# Altium footprint library LDCN Components.PcbLib: 426 footprints (part 4 of 27)
Each footprint in its own frame and in the unit in brackets; x right, y up, seen from the top. Pads: shape width x height; smd on the part's side, far side on the other; paste and mask are expansions set on the pad; w line width, h text height; cw(c..) or ccw(c..) is an arc to the next point about the centre after c.
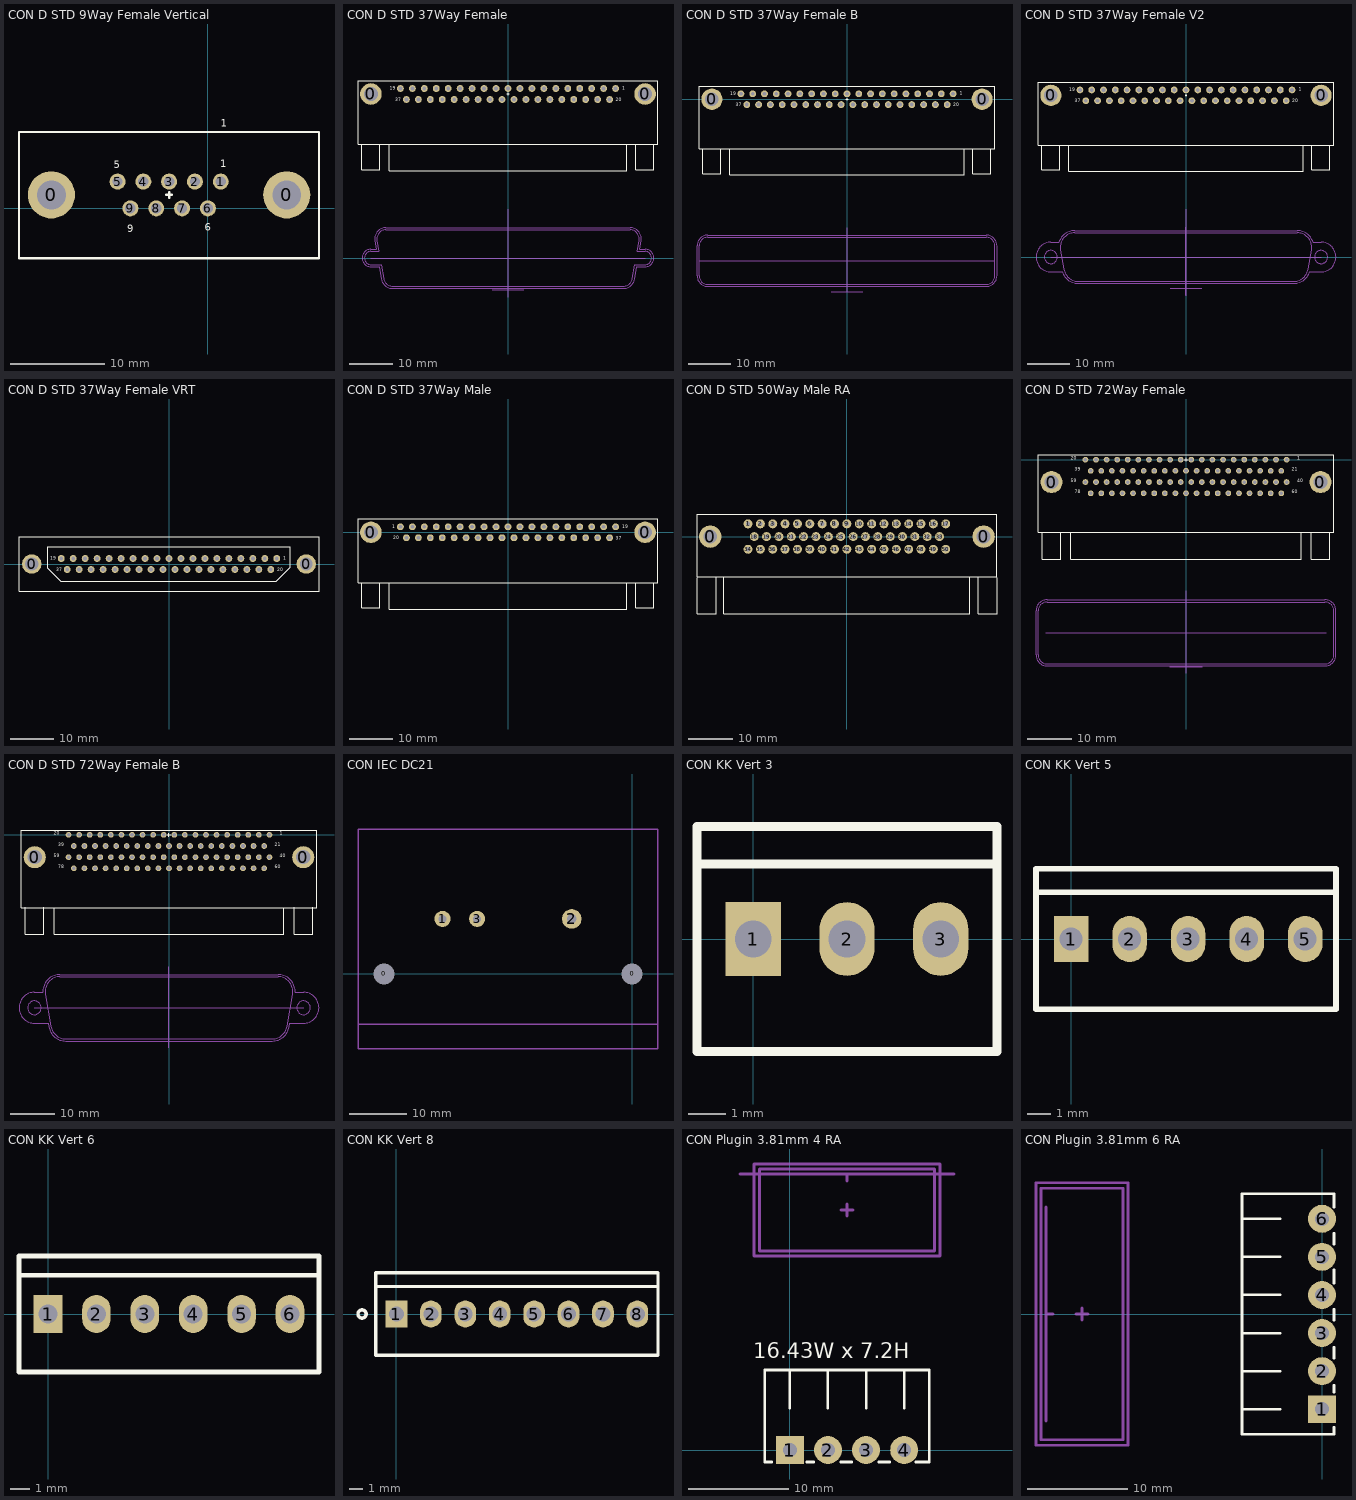
[diagram p3: the footprints below, top view; thin cyan lines are the x and y axes]

## CON D STD 9Way Female Vertical [mm] "CONN D-SUB RCPT 9POS VERT SLDR"
height 12.17
pads (11):
  round 5 hole 3.05: 0(-16.61,1.42) 0(8.38,1.42)
  round 1.7 hole 1.1: 1(1.37,2.84) 2(-1.37,2.84) 3(-4.11,2.84) 4(-6.85,2.84) 5(-9.59,2.84) 6(0,0) 7(-2.74,0) 8(-5.48,0) 9(-8.22,0)
Top Overlay:
  lines w0.254: -4.415,1.42 -3.815,1.42 ; -4.115,1.12 -4.115,1.72 ; -20.05,-5.3 11.8,-5.3 11.8,8.1 -20.05,8.1 -20.05,-5.3
  text "1" at 1.375,8.64 h0.76
  text "6" at -0.325,-2.36 h0.76
  text "9" at -8.575,-2.56 h0.76
  text "5" at -9.975,4.24 h0.76
  text "1" at 1.325,4.34 h0.76
3D body "c-3-338313-2-e-3d.stp": height 12.16, standoff -3.23, extent -19.57,-4.86 11.42,7.79

## CON D STD 37Way Female [mm] "37 Way Male D Sub RA PCB"
pads (39):
  round 5 hole 3.2: 0(-31.75,38) 0(31.75,38)
  round 1.6 hole 0.9: 1(24.93,39.27) 2(22.16,39.27) 3(19.39,39.27) 4(16.62,39.27) 5(13.85,39.27) 6(11.08,39.27) 7(8.31,39.27) 8(5.54,39.27) 9(2.77,39.27) 10(0,39.27) 11(-2.77,39.27) 12(-5.54,39.27) 13(-8.31,39.27) 14(-11.08,39.27) 15(-13.85,39.27) 16(-16.62,39.27) 17(-19.39,39.27) 18(-22.16,39.27) 19(-24.93,39.27) 20(23.545,36.73) 21(20.775,36.73) 22(18.005,36.73) 23(15.235,36.73) 24(12.465,36.73) 25(9.695,36.73) 26(6.925,36.73) 27(4.155,36.73) 28(1.385,36.73) 29(-1.385,36.73) 30(-4.155,36.73) 31(-6.925,36.73) 32(-9.695,36.73) 33(-12.465,36.73) 34(-15.235,36.73) 35(-18.005,36.73) 36(-20.775,36.73) 37(-23.545,36.73)
Top Overlay:
  lines w0.254: -33.9,26.3 -33.9,20.5 -29.7,20.5 -29.7,26.3 ; -27.5,26.3 -27.5,20.2 27.5,20.2 27.5,26.3 ; -19.05,20.2 19.05,20.2 ; -0.3,38 0.3,38 ; 0,37.7 0,38.3 ; 29.6,26.3 29.6,20.5 33.8,20.5 33.8,26.3 ; -34.75,26.3 -34.75,41.1 34.75,41.1 34.75,26.3 -34.75,26.3
  text "1" at 26.485,39.03 h0.76
  text "19" at -27.415,38.93 h0.76
  text "20" at 24.985,36.33 h0.76
  text "37" at -26.115,36.33 h0.76
Mechanical 21:
  lines w0.254: -28.796,-4.785 ccw(c-26.718,-4.419) -26.718,-6.529 ; -28.795,-4.785 -29.37,-1.523 -31.75,-1.524 cw(c-31.75,0) -31.75,1.524 -29.908,1.524 -30.353,4.049 cw(c-28.275,4.415) -28.275,6.525 ; -28.275,6.53 0,6.53 28.275,6.53 ; -26.718,-6.53 0,-6.53 26.718,-6.53 ; 26.718,-6.529 ccw(c26.718,-4.419) 28.796,-4.785 ; 28.275,6.525 cw(c28.275,4.415) 30.353,4.049 29.908,1.524 31.75,1.524 cw(c31.75,0) 31.75,-1.524 29.37,-1.523 28.795,-4.785
Mechanical 22:
  lines w0.254: -31.75,0 31.75,0 ; -3.65,-7.3 3.65,-7.3 ; 0,-9.125 0,11.25 ; 0,-7.3 0,0
Mechanical 25:
  lines w0.254: -30.851,3.968 -30.508,2.024 -31.75,2.024 ccw(c-31.75,0) -31.75,-2.024 -29.87,-2.023 -29.367,-4.875 ccw(c-26.797,-4.422) -26.797,-7.032 0,-7.032 26.797,-7.032 ccw(c26.797,-4.422) 29.367,-4.875 29.87,-2.023 31.75,-2.024 ccw(c31.75,0) 31.75,2.024 30.508,2.024 30.851,3.968 ; -30.849,3.968 cw(c-28.279,4.421) -28.279,7.031 -0.1,7.031 ; 0.1,7.031 28.279,7.031 cw(c28.279,4.421) 30.849,3.968

## CON D STD 37Way Female B [mm] "37 Way Male D Sub RA PCB"
pads (39):
  round 5 hole 3.2: 0(-31.75,0) 0(31.75,0)
  round 1.6 hole 0.9: 1(24.93,1.27) 2(22.16,1.27) 3(19.39,1.27) 4(16.62,1.27) 5(13.85,1.27) 6(11.08,1.27) 7(8.31,1.27) 8(5.54,1.27) 9(2.77,1.27) 10(0,1.27) 11(-2.77,1.27) 12(-5.54,1.27) 13(-8.31,1.27) 14(-11.08,1.27) 15(-13.85,1.27) 16(-16.62,1.27) 17(-19.39,1.27) 18(-22.16,1.27) 19(-24.93,1.27) 20(23.545,-1.27) 21(20.775,-1.27) 22(18.005,-1.27) 23(15.235,-1.27) 24(12.465,-1.27) 25(9.695,-1.27) 26(6.925,-1.27) 27(4.155,-1.27) 28(1.385,-1.27) 29(-1.385,-1.27) 30(-4.155,-1.27) 31(-6.925,-1.27) 32(-9.695,-1.27) 33(-12.465,-1.27) 34(-15.235,-1.27) 35(-18.005,-1.27) 36(-20.775,-1.27) 37(-23.545,-1.27)
Top Overlay:
  lines w0.254: -33.9,-11.7 -33.9,-17.5 -29.7,-17.5 -29.7,-11.7 ; -27.5,-11.7 -27.5,-17.8 27.5,-17.8 27.5,-11.7 ; -19.05,-17.8 19.05,-17.8 ; -0.25,0 0.25,0 ; 0,-0.25 0,0.25 ; 29.6,-11.7 29.6,-17.5 33.8,-17.5 33.8,-11.7 ; -34.75,-11.7 34.75,-11.7 34.75,3.1 -34.75,3.1 -34.75,-11.7
  text "37" at -26.115,-1.67 h0.76
  text "20" at 24.985,-1.67 h0.76
  text "19" at -27.415,0.93 h0.76
  text "1" at 26.485,1.03 h0.76
Mechanical 21:
  lines w0.254: -34.75,-41.53 ccw(c-32.75,-41.53) -32.75,-43.53 0,-43.53 26.718,-43.53 32.75,-43.53 ccw(c32.75,-41.53) 34.75,-41.53 34.75,-34.47 ccw(c32.75,-34.47) 32.75,-32.47 28.275,-32.47 0,-32.47 -32.75,-32.47 ccw(c-32.75,-34.47) -34.75,-34.47 -34.75,-41.53
Mechanical 22:
  lines w0.254: -34.75,-38 34.75,-38 ; -3.65,-45.3 3.65,-45.3 ; 0,-45.3 0,-30.2
Mechanical 25:
  lines w0.254: -35.25,-41.47 ccw(c-32.75,-41.47) -32.75,-43.97 32.75,-43.97 ccw(c32.75,-41.47) 35.25,-41.47 35.25,-34.47 ccw(c32.75,-34.47) 32.75,-31.97 0,-31.97 -32.75,-31.97 ccw(c-32.75,-34.47) -35.25,-34.47 -35.25,-41.47

## CON D STD 37Way Female V2 [mm] "37 Way Male D Sub RA PCB"
pads (39):
  round 5 hole 3.2: 0(-31.75,38) 0(31.75,38)
  round 1.6 hole 0.9: 1(24.93,39.27) 2(22.16,39.27) 3(19.39,39.27) 4(16.62,39.27) 5(13.85,39.27) 6(11.08,39.27) 7(8.31,39.27) 8(5.54,39.27) 9(2.77,39.27) 10(0,39.27) 11(-2.77,39.27) 12(-5.54,39.27) 13(-8.31,39.27) 14(-11.08,39.27) 15(-13.85,39.27) 16(-16.62,39.27) 17(-19.39,39.27) 18(-22.16,39.27) 19(-24.93,39.27) 20(23.545,36.73) 21(20.775,36.73) 22(18.005,36.73) 23(15.235,36.73) 24(12.465,36.73) 25(9.695,36.73) 26(6.925,36.73) 27(4.155,36.73) 28(1.385,36.73) 29(-1.385,36.73) 30(-4.155,36.73) 31(-6.925,36.73) 32(-9.695,36.73) 33(-12.465,36.73) 34(-15.235,36.73) 35(-18.005,36.73) 36(-20.775,36.73) 37(-23.545,36.73)
Top Overlay:
  lines w0.254: -33.9,26.3 -33.9,20.5 -29.7,20.5 -29.7,26.3 ; -27.5,26.3 -27.5,20.2 27.5,20.2 27.5,26.3 ; -19.05,20.2 19.05,20.2 ; -0.2,38 0.2,38 ; 0,37.8 0,38.2 ; 29.6,26.3 29.6,20.5 33.8,20.5 33.8,26.3 ; -34.75,26.3 34.75,26.3 34.75,41.1 -34.75,41.1 -34.75,26.3
  text "37" at -26.115,36.33 h0.76
  text "20" at 24.985,36.33 h0.76
  text "19" at -27.415,38.93 h0.76
  text "1" at 26.485,39.03 h0.76
Mechanical 2:
  lines w0.013: 0,-9 0,7
Mechanical 21:
  circle w0.254: c31.75,0 r1.55
  circle w0.254: c-31.75,0 r1.55
  lines w0.254: 25.339,-5.7 ccw(c25.339,-2.3) 28.687,-2.89 ; 25.339,-5.7 ccw(c25.339,-2.3) 28.687,-2.89 ; 25.339,-5.7 -25.339,-5.7 cw(c-25.339,-2.3) -28.687,-2.89 -29.498,1.71 cw(c-26.15,2.3) -26.15,5.7 26.15,5.7 ; 26.15,5.7 cw(c26.15,2.3) 29.498,1.71 ; 26.15,5.7 cw(c26.15,2.3) 29.498,1.71 ; 28.687,-2.89 29.498,1.71
Mechanical 22:
  lines w0.254: -31.75,0 31.75,0 ; -3.65,-7.3 3.65,-7.3 ; 0,-9.125 0,11.25 ; 0,-7.3 0,0
Mechanical 25:
  lines w0.254: -29.861,3.5 cw(c-26.15,2.3) -26.15,6.2 26.15,6.2 cw(c26.15,2.3) 29.861,3.5 ; -29.861,3.501 -31.75,3.5 ccw(c-31.75,0) -31.75,-3.5 -29.05,-3.499 ; -29.05,-3.498 ccw(c-25.339,-2.3) -25.339,-6.2 25.339,-6.2 ccw(c25.339,-2.3) 29.05,-3.498 ; 29.05,-3.499 31.75,-3.5 ccw(c31.75,0) 31.75,3.5 29.861,3.501

## CON D STD 37Way Female VRT [mm] "37 Way Male D Sub Vertical PCB"
pads (39):
  round 4.5 hole 3.1 unplated: 0(-31.75,0)
  round 4.5 hole 3 unplated: 0(31.75,0)
  round 1.6 hole 0.9: 1(24.93,1.27) 2(22.16,1.27) 3(19.39,1.27) 4(16.62,1.27) 5(13.85,1.27) 6(11.08,1.27) 7(8.31,1.27) 8(5.54,1.27) 9(2.77,1.27) 10(0,1.27) 11(-2.77,1.27) 12(-5.54,1.27) 13(-8.31,1.27) 14(-11.08,1.27) 15(-13.85,1.27) 16(-16.62,1.27) 17(-19.39,1.27) 18(-22.16,1.27) 19(-24.93,1.27) 20(23.545,-1.27) 21(20.775,-1.27) 22(18.005,-1.27) 23(15.235,-1.27) 24(12.465,-1.27) 25(9.695,-1.27) 26(6.925,-1.27) 27(4.155,-1.27) 28(1.385,-1.27) 29(-1.385,-1.27) 30(-4.155,-1.27) 31(-6.925,-1.27) 32(-9.695,-1.27) 33(-12.465,-1.27) 34(-15.235,-1.27) 35(-18.005,-1.27) 36(-20.775,-1.27) 37(-23.545,-1.27)
Top Overlay:
  lines w0.254: -34.7,-6.275 -34.7,6.275 34.7,6.275 34.7,-6.275 -34.7,-6.275 ; -28,-1 -28,4 28,4 28,-0.8 24.8,-4 -25,-4 -28,-1
  text "37" at -26.115,-1.67 h0.76
  text "20" at 24.985,-1.67 h0.76
  text "19" at -27.415,0.93 h0.76
  text "1" at 26.485,1.03 h0.76

## CON D STD 37Way Male [mm] "37 Way Male D Sub RA PCB"
pads (39):
  round 5 hole 3.2 unplated: 0(-31.75,0) 0(31.75,0)
  round 1.6 hole 0.9: 1(-24.93,1.27) 2(-22.16,1.27) 3(-19.39,1.27) 4(-16.62,1.27) 5(-13.85,1.27) 6(-11.08,1.27) 7(-8.31,1.27) 8(-5.54,1.27) 9(-2.77,1.27) 10(0,1.27) 11(2.77,1.27) 12(5.54,1.27) 13(8.31,1.27) 14(11.08,1.27) 15(13.85,1.27) 16(16.62,1.27) 17(19.39,1.27) 18(22.16,1.27) 19(24.93,1.27) 20(-23.545,-1.27) 21(-20.775,-1.27) 22(-18.005,-1.27) 23(-15.235,-1.27) 24(-12.465,-1.27) 25(-9.695,-1.27) 26(-6.925,-1.27) 27(-4.155,-1.27) 28(-1.385,-1.27) 29(1.385,-1.27) 30(4.155,-1.27) 31(6.925,-1.27) 32(9.695,-1.27) 33(12.465,-1.27) 34(15.235,-1.27) 35(18.005,-1.27) 36(20.775,-1.27) 37(23.545,-1.27)
Top Overlay:
  lines w0.254: -33.9,-11.7 -33.9,-17.5 -29.7,-17.5 -29.7,-11.7 ; -27.5,-11.7 -27.5,-17.8 27.5,-17.8 27.5,-11.7 ; -19.05,-17.8 19.05,-17.8 ; 29.6,-11.7 29.6,-17.5 33.8,-17.5 33.8,-11.7 ; -34.75,-11.7 -34.75,3.1 34.75,3.1 34.75,-11.7 -34.75,-11.7
  text "1" at -26.784,0.916 h0.76
  text "19" at 26.5,0.9 h0.76
  text "20" at -26.53,-1.624 h0.76
  text "37" at 24.93,-1.7 h0.76

## CON D STD 50Way Male RA [mm] "50 Way Male D Sub RA PCB"
height 16
pads (52):
  round 5 hole 3.1: 0(-30.55,0) 0(30.55,0)
  round 2 hole 1: 1(-22.1,2.84) 2(-19.33,2.84) 3(-16.56,2.84) 4(-13.82,2.84) 5(-11.05,2.84) 6(-8.28,2.84) 7(-5.54,2.84) 8(-2.77,2.84) 9(0,2.84) 10(2.77,2.84) 11(5.54,2.84) 12(8.28,2.84) 13(11.05,2.84) 14(13.82,2.84) 15(16.56,2.84) 16(19.33,2.84) 17(22.1,2.84) 18(-20.7,0) 19(-17.96,0) 20(-15.19,0) 21(-12.42,0) 22(-9.68,0) 23(-6.91,0) 24(-4.14,0) 25(-1.4,0) 26(1.4,0) 27(4.14,0) 28(6.91,0) 29(9.68,0) 30(12.42,0) 31(15.19,0) 32(17.96,0) 33(20.7,0) 34(-22.1,-2.84) 35(-19.33,-2.84) 36(-16.56,-2.84) 37(-13.82,-2.84) 38(-11.05,-2.84) 39(-8.28,-2.84) 40(-5.54,-2.84) 41(-2.77,-2.84) 42(0,-2.84) 43(2.77,-2.84) 44(5.54,-2.84) 45(8.28,-2.84) 46(11.05,-2.84) 47(13.82,-2.84) 48(16.56,-2.84) 49(19.33,-2.84) 50(22.1,-2.84)
Top Overlay:
  lines w0.254: -33.4,-9.2 -33.4,-17.25 -29.2,-17.25 -29.2,-9.2 ; -27.5,-9.2 -27.5,-17.25 27.5,-17.25 27.5,-9.2 ; 29.35,-9.2 29.35,-17.25 33.55,-17.25 33.55,-9.2 ; 33.5,-9 -33.5,-9 -33.5,5 33.5,5 33.5,-8.95
Mechanical 1:
  text "BOARD EDGE" at 24,-8.483 h1.52
3D body "163A18649X.stp": height 15.2, standoff -3.56, extent -33.5,-17.33 33.5,4.97

## CON D STD 72Way Female [mm] "72 Way Male D Sub RA PCB"
pads (80):
  round 5 hole 3.2: 0(-30.48,-5.08) 0(30.48,-5.08)
  round 1.3 hole 0.8: 1(22.8,0) 2(20.4,0) 3(18,0) 4(15.6,0) 5(13.2,0) 6(10.8,0) 7(8.4,0) 8(6,0) 9(3.6,0) 10(1.2,0) 11(-1.2,0) 12(-3.6,0) 13(-6,0) 14(-8.4,0) 15(-10.8,0) 16(-13.2,0) 17(-15.6,0) 18(-18,0) 19(-20.4,0) 20(-22.8,0) 21(21.6,-2.54) 22(19.2,-2.54) 23(16.8,-2.54) 24(14.4,-2.54) 25(12,-2.54) 26(9.6,-2.54) 27(7.2,-2.54) 28(4.8,-2.54) 29(2.4,-2.54) 30(0,-2.54) 31(-2.4,-2.54) 32(-4.8,-2.54) 33(-7.2,-2.54) 34(-9.6,-2.54) 35(-12,-2.54) 36(-14.4,-2.54) 37(-16.8,-2.54) 38(-19.2,-2.54) 39(-21.6,-2.54) 40(22.8,-5.08) 41(20.4,-5.08) 42(18,-5.08) 43(15.6,-5.08) 44(13.2,-5.08) 45(10.8,-5.08) 46(8.4,-5.08) 47(6,-5.08) 48(3.6,-5.08) 49(1.2,-5.08) 50(-1.2,-5.08) 51(-3.6,-5.08) 52(-6,-5.08) 53(-8.4,-5.08) 54(-10.8,-5.08) 55(-13.2,-5.08) 56(-15.6,-5.08) 57(-18,-5.08) 58(-20.4,-5.08) 59(-22.8,-5.08) 60(21.6,-7.62) 61(19.2,-7.62) 62(16.8,-7.62) 63(14.4,-7.62) 64(12,-7.62) 65(9.6,-7.62) 66(7.2,-7.62) 67(4.8,-7.62) 68(2.4,-7.62) 69(0,-7.62) 70(-2.4,-7.62) 71(-4.8,-7.62) 72(-7.2,-7.62) 73(-9.6,-7.62) 74(-12,-7.62) 75(-14.4,-7.62) 76(-16.8,-7.62) 77(-19.2,-7.62) 78(-21.6,-7.62)
Top Overlay:
  lines w0.254: -32.58,-16.5 -32.58,-22.6 -28.38,-22.6 -28.38,-16.5 ; -26.1,-16.51 -26.1,-22.61 26.1,-22.61 26.1,-16.51 ; -0.4,0 0.4,0 ; 0,-0.4 0,0.4 ; 28.38,-16.5 28.38,-22.6 32.58,-22.6 32.58,-16.5 ; -33.5,-16.51 33.5,-16.51 33.5,1.09 -33.5,1.09 -33.5,-16.51
  text "60" at 24,-7.62 h0.76
  text "40" at 25.2,-5.08 h0.76
  text "1" at 25.2,0 h0.76
  text "20" at -26.115,0 h0.76
  text "21" at 24,-2.54 h0.76
  text "39" at -25.2,-2.54 h0.76
  text "78" at -25.2,-7.62 h0.76
  text "59" at -26.115,-5.08 h0.76
Mechanical 21:
  lines w0.254: -33.5,-44.27 ccw(c-31.5,-44.27) -31.5,-46.27 0,-46.27 31.5,-46.27 ccw(c31.5,-44.27) 33.5,-44.27 33.5,-34.27 ccw(c31.5,-34.27) 31.5,-32.27 0,-32.27 -31.5,-32.27 ccw(c-31.5,-34.27) -33.5,-34.27 -33.5,-44.27
Mechanical 22:
  lines w0.254: -31.75,-39.27 31.75,-39.27 ; -3.65,-46.92 3.65,-46.92 ; 0,-48.395 0,-29.77 ; 0,-46.57 0,-39.27
Mechanical 25:
  lines w0.254: -34,-44.27 ccw(c-31.5,-44.27) -31.5,-46.77 0,-46.77 31.5,-46.77 ccw(c31.5,-44.27) 34,-44.27 34,-34.27 ccw(c31.5,-34.27) 31.5,-31.77 0,-31.77 -31.5,-31.77 ccw(c-31.5,-34.27) -34,-34.27 -34,-44.27

## CON D STD 72Way Female B [mm] "72 Way Male D Sub RA PCB"
pads (80):
  round 5 hole 3.2: 0(-30.48,-5.08) 0(30.48,-5.08)
  round 1.3 hole 0.8: 1(22.8,0) 2(20.4,0) 3(18,0) 4(15.6,0) 5(13.2,0) 6(10.8,0) 7(8.4,0) 8(6,0) 9(3.6,0) 10(1.2,0) 11(-1.2,0) 12(-3.6,0) 13(-6,0) 14(-8.4,0) 15(-10.8,0) 16(-13.2,0) 17(-15.6,0) 18(-18,0) 19(-20.4,0) 20(-22.8,0) 21(21.6,-2.54) 22(19.2,-2.54) 23(16.8,-2.54) 24(14.4,-2.54) 25(12,-2.54) 26(9.6,-2.54) 27(7.2,-2.54) 28(4.8,-2.54) 29(2.4,-2.54) 30(0,-2.54) 31(-2.4,-2.54) 32(-4.8,-2.54) 33(-7.2,-2.54) 34(-9.6,-2.54) 35(-12,-2.54) 36(-14.4,-2.54) 37(-16.8,-2.54) 38(-19.2,-2.54) 39(-21.6,-2.54) 40(22.8,-5.08) 41(20.4,-5.08) 42(18,-5.08) 43(15.6,-5.08) 44(13.2,-5.08) 45(10.8,-5.08) 46(8.4,-5.08) 47(6,-5.08) 48(3.6,-5.08) 49(1.2,-5.08) 50(-1.2,-5.08) 51(-3.6,-5.08) 52(-6,-5.08) 53(-8.4,-5.08) 54(-10.8,-5.08) 55(-13.2,-5.08) 56(-15.6,-5.08) 57(-18,-5.08) 58(-20.4,-5.08) 59(-22.8,-5.08) 60(21.6,-7.62) 61(19.2,-7.62) 62(16.8,-7.62) 63(14.4,-7.62) 64(12,-7.62) 65(9.6,-7.62) 66(7.2,-7.62) 67(4.8,-7.62) 68(2.4,-7.62) 69(0,-7.62) 70(-2.4,-7.62) 71(-4.8,-7.62) 72(-7.2,-7.62) 73(-9.6,-7.62) 74(-12,-7.62) 75(-14.4,-7.62) 76(-16.8,-7.62) 77(-19.2,-7.62) 78(-21.6,-7.62)
Top Overlay:
  lines w0.254: -32.58,-16.5 -32.58,-22.6 -28.38,-22.6 -28.38,-16.5 ; -26.1,-16.51 -26.1,-22.61 26.1,-22.61 26.1,-16.51 ; -0.4,0 0.4,0 ; 0,-0.4 0,0.4 ; 28.38,-16.5 28.38,-22.6 32.58,-22.6 32.58,-16.5 ; -33.5,-16.51 -33.5,1.09 33.5,1.09 33.5,-16.51 -33.5,-16.51
  text "59" at -26.115,-5.08 h0.76
  text "78" at -25.2,-7.62 h0.76
  text "39" at -25.2,-2.54 h0.76
  text "21" at 24,-2.54 h0.76
  text "20" at -26.115,0 h0.76
  text "1" at 25.2,0 h0.76
  text "40" at 25.2,-5.08 h0.76
  text "60" at 24,-7.62 h0.76
Mechanical 21:
  circle w0.254: c30.555,-39.27 r1.55
  circle w0.254: c-30.555,-39.27 r1.55
  lines w0.254: 24.75,-32.22 cw(c24.75,-35.62) 28.098,-36.21 ; 24.75,-32.22 cw(c24.75,-35.62) 28.098,-36.21 ; 24.75,-32.22 -24.75,-32.22 ccw(c-24.75,-35.62) -28.098,-36.21 -26.811,-43.51 ccw(c-23.463,-42.92) -23.463,-46.32 23.463,-46.32 ccw(c23.463,-42.92) 26.811,-43.51 28.098,-36.21
Mechanical 22:
  lines w0.254: -30.555,-39.27 30.555,-39.27 ; -3.65,-46.92 3.65,-46.92 ; 0,-48.395 0,-30
Mechanical 25:
  lines w0.254: -30.555,-42.77 cw(c-30.555,-39.27) -30.555,-35.77 -28.647,-35.77 cw(c-24.75,-35.62) -24.75,-31.72 24.75,-31.72 cw(c24.75,-35.62) 28.647,-35.77 30.555,-35.77 cw(c30.555,-39.27) 30.555,-42.77 27.449,-42.77 27.304,-43.597 cw(c23.463,-42.92) 23.463,-46.82 -23.463,-46.82 cw(c-23.463,-42.92) -27.304,-43.597 -27.449,-42.77 -30.555,-42.77

## CON IEC DC21 [mm] "Power Entry Connector Receptacle, Male Blades - Module IEC 320-C14 Panel Mount, Flange; Through Hole, Right Angle"
height 32
pads (5):
  round 1.524 hole 3.7: 0(-43,0) 0(0,0)
  round 2.8 hole 1.4: 1(-32.85,9.55) 3(-26.85,9.55)
  round 3.4 hole 1.7: 2(-10.45,9.55)
Mechanical 1:
  lines w0.254: -47.5,-8.7 4.5,-8.7 ; -47.5,-13.001 4.5,-13.001 4.5,25.111 -47.5,25.111 -47.5,-13.001
  text "Board Edge" at -12.246,-7.888 h1.52
3D body "e_0100.2451_001.step": height 31.75, standoff -4.51, extent -47.5,-13.001 4.5,25.111

## CON KK Vert 3 [mm] "Vertical KK Header 3 Way"
height 10
pads (3):
  rect 1.5x2 hole 1: 1(0,0)
  oval 1.5x2 hole 1: 2(2.54,0) 3(5.08,0)
Top Overlay:
  lines w0.254: -1.524,2.032 6.604,2.032 ; -1.524,-3.048 6.604,-3.048 6.604,3.048 -1.524,3.048 -1.524,-3.048

## CON KK Vert 5 [mm] "Vertical KK Header 5 Way"
height 10
pads (5):
  rect 1.5x2 hole 1: 1(0,0)
  oval 1.5x2 hole 1: 2(2.54,0) 3(5.08,0) 4(7.62,0) 5(10.16,0)
Top Overlay:
  lines w0.254: -1.524,2.032 6.604,2.032 ; 6.096,-3.048 11.5,-3.048 11.5,3.048 6.096,3.048 ; 6.096,2.032 11.5,2.032 ; 6.604,-3.048 -1.524,-3.048 -1.524,3.048 6.604,3.048

## CON KK Vert 6 [mm] "Vertical KK Header 6 Way"
height 10
pads (6):
  rect 1.5x2 hole 1: 1(0,0)
  oval 1.5x2 hole 1: 2(2.54,0) 3(5.08,0) 4(7.62,0) 5(10.16,0) 6(12.7,0)
Top Overlay:
  lines w0.254: -1.524,2.032 6.604,2.032 ; 6.096,-3.048 14.224,-3.048 14.224,3.048 6.096,3.048 ; 6.096,2.032 14.224,2.032 ; 6.604,-3.048 -1.524,-3.048 -1.524,3.048 6.604,3.048

## CON KK Vert 8 [mm] "Vertical KK Header 8 Way"
height 10
pads (8):
  rect 1.6x2 hole 1.1: 1(0,0)
  oval 1.6x2 hole 1.1: 2(2.54,0) 3(5.08,0) 4(7.62,0) 5(10.16,0) 6(12.7,0) 7(15.24,0) 8(17.78,0)
Top Overlay:
  circle w0.254: c-2.54,0 r0.3
  lines w0.254: -1.524,2.032 6.604,2.032 ; 6.096,-3.048 19.304,-3.048 19.304,3.048 6.096,3.048 ; 6.096,2.032 19.304,2.032 ; 6.604,-3.048 -1.524,-3.048 -1.524,3.048 6.604,3.048

## CON Plugin 3.81mm 4 RA [mm] "FCI RA Header"
height 8
pads (4):
  rect 2.8x2.8 hole 1.4: 1(0,0)
  round 2.8 hole 1.4: 2(3.81,0) 3(7.62,0) 4(11.43,0)
Top Overlay:
  lines w0.254: -1.8,-1.2 -2.5,-1.2 -2.5,8 13.93,8 13.93,-1.2 12.6,-1.2 ; 0,4.2 0,8 ; 1.7,-1.2 2.4,-1.2 ; 3.81,4.2 3.81,8 ; 5.1,-1.2 6.2,-1.2 ; 7.62,4.2 7.62,8 ; 8.9,-1.2 10,-1.2 ; 11.43,4.2 11.43,8
  text "16.43W x 7.2H" at -3.685,9.2 h1.52
Mechanical 21:
  lines w0.254: -3.035,19.9 14.465,19.9 14.465,28.1 -3.035,28.1 -3.035,19.9
Mechanical 22:
  lines w0.254: -4.985,27.6 16.415,27.6 ; 5.115,24 6.315,24 ; 5.715,23.4 5.715,24.6 ; 5.715,26.9 5.715,27.6
Mechanical 25:
  lines w0.254: -3.585,19.4 -3.585,28.6 15.015,28.6 15.015,19.4 -3.585,19.4

## CON Plugin 3.81mm 6 RA [mm] "FCI RA Header"
height 8
pads (6):
  rect 2.8x2.8 hole 1.4: 1(0,-9.525)
  round 2.8 hole 1.4: 2(0,-5.715) 3(0,-1.905) 4(0,1.905) 5(0,5.715) 6(0,9.525)
Top Overlay:
  lines w0.254: -8,-9.525 -4.2,-9.525 ; -8,-5.715 -4.2,-5.715 ; -8,-1.905 -4.2,-1.905 ; -8,1.905 -4.2,1.905 ; -8,5.715 -4.2,5.715 ; -8,9.525 -4.2,9.525 ; 1.2,-11.325 1.2,-12.025 -8,-12.025 -8,12.025 1.2,12.025 1.2,10.695 ; 1.2,-7.825 1.2,-7.125 ; 1.2,-4.425 1.2,-3.325 ; 1.2,-0.625 1.2,0.475 ; 1.2,3.075 1.2,4.405 ; 1.2,6.995 1.2,8.095
Mechanical 21:
  lines w0.254: -28.1,-12.56 -28.1,12.56 -19.9,12.56 -19.9,-12.56 -28.1,-12.56
Mechanical 22:
  lines w0.254: -27.6,-10.7 -27.6,10.7 ; -27.6,0 -26.9,0 ; -24.6,0 -23.4,0 ; -24,-0.6 -24,0.6
Mechanical 25:
  lines w0.254: -28.6,-13.11 -19.4,-13.11 -19.4,13.11 -28.6,13.11 -28.6,-13.11